# Altium footprint library CAP_TH.PcbLib: 219 footprints (part 8 of 14)
Each footprint in its own frame and in the unit in brackets; x right, y up, seen from the top. Pads: shape width x height; smd on the part's side, far side on the other; paste and mask are expansions set on the pad; w line width, h text height; cw(c..) or ccw(c..) is an arc to the next point about the centre after c.
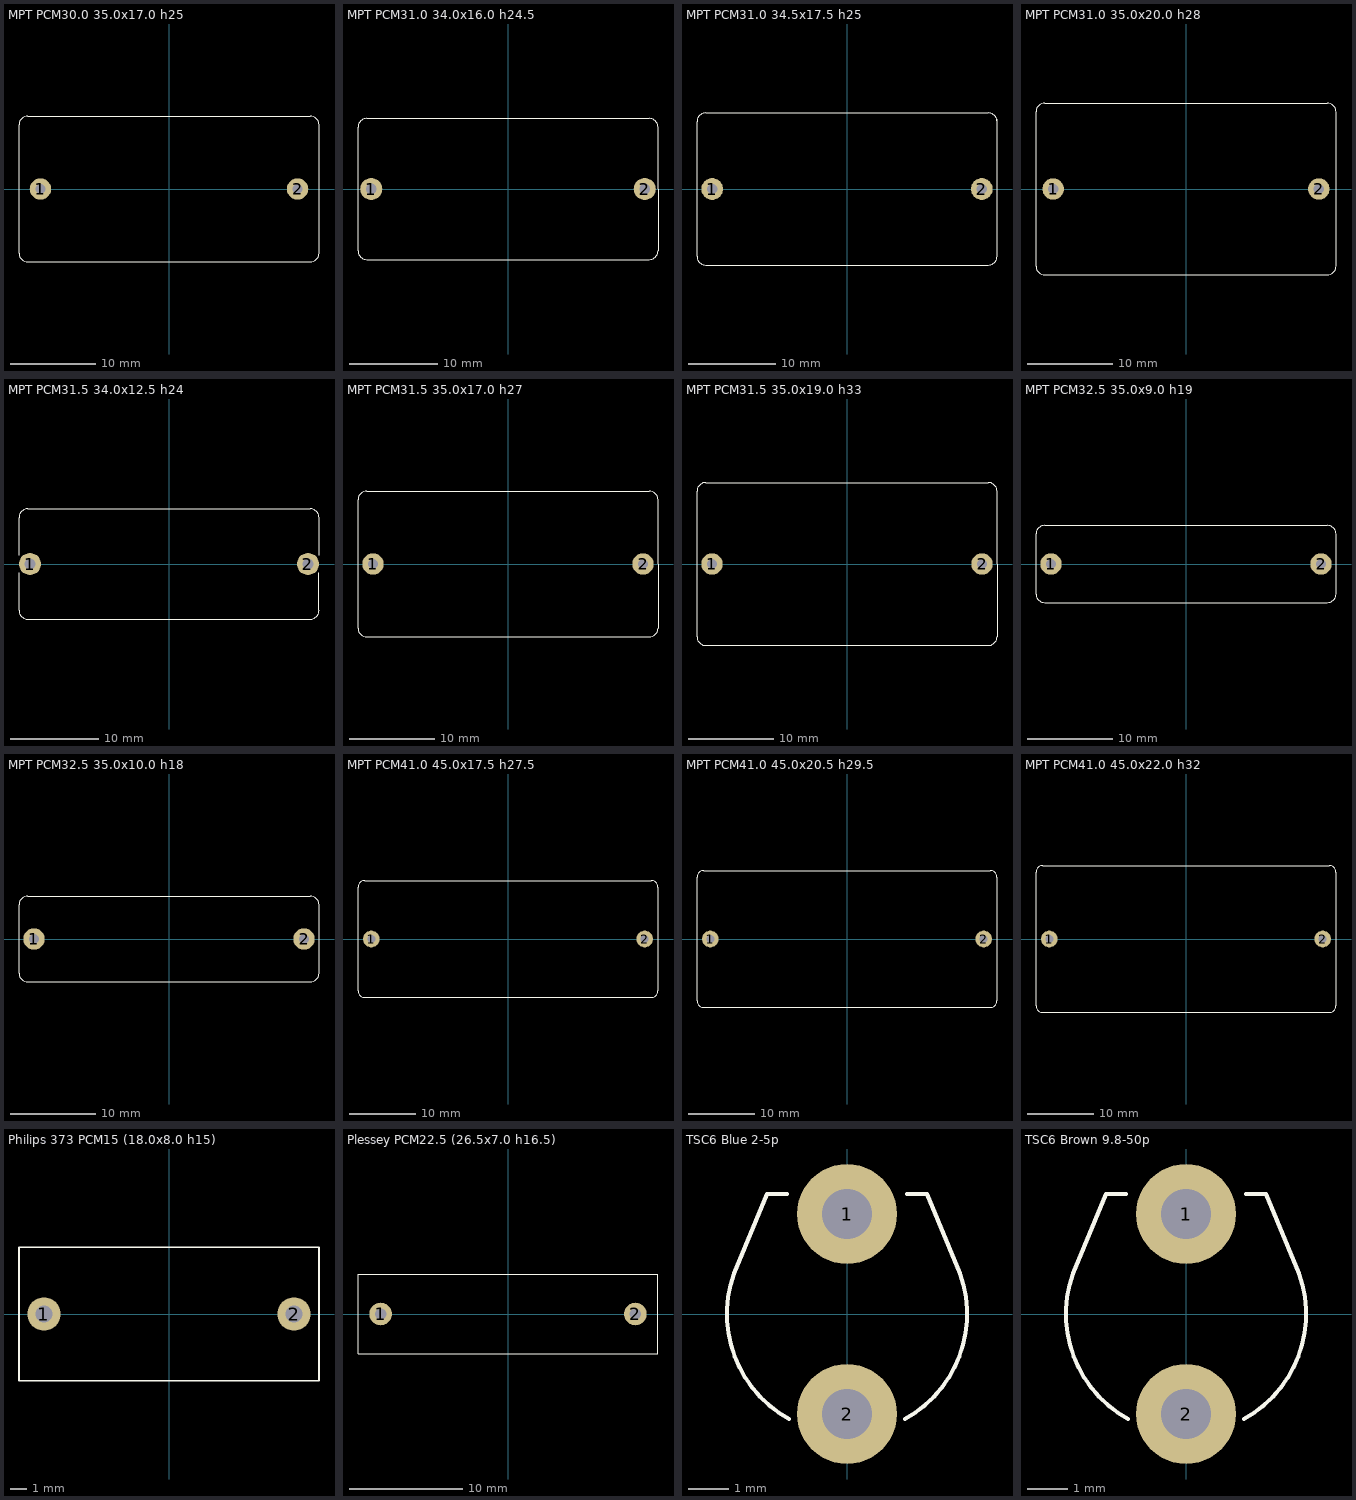
[diagram p7: the footprints below, top view; thin cyan lines are the x and y axes]

## MPT PCM30.0 35.0x17.0 h25 [mm]
pads (2):
  round 2.5 hole 1.2: 1(-15,0) 2(15,0)
Top Overlay:
  lines w0.1: -17.5,-7.5 ccw(c-16.5,-7.5) -16.5,-8.5 16.5,-8.5 ccw(c16.5,-7.5) 17.5,-7.5 17.5,7.5 ccw(c16.5,7.5) 16.5,8.5 -16.5,8.5 ccw(c-16.5,7.5) -17.5,7.5 -17.5,-7.5
3D body "MPT PCM30.0 35.0x17.0 h25.STEP": height 27, standoff -2, extent -17.5,-8.5 17.5,8.5

## MPT PCM31.0 34.0x16.0 h24.5 [mm]
pads (2):
  round 2.5 hole 1.2: 1(-15.5,0) 2(15.5,0)
Top Overlay:
  lines w0.1: -17,-7 ccw(c-16,-7) -16,-8 16,-8 ccw(c16,-7) 17,-7 17,7 ccw(c16,7) 16,8 -16,8 ccw(c-16,7) -17,7 -17,-7
3D body "MPT PCM31.0 34.0x16.0 h24.5.STEP": height 26.5, standoff -2, extent -17,-8 17,8

## MPT PCM31.0 34.5x17.5 h25 [mm]
pads (2):
  round 2.5 hole 1.2: 1(-15.5,0) 2(15.5,0)
Top Overlay:
  lines w0.1: 17.25,7.75 ccw(c16.25,7.75) 16.25,8.75 -16.25,8.75 ccw(c-16.25,7.75) -17.25,7.75 -17.25,-7.75 ccw(c-16.25,-7.75) -16.25,-8.75 16.25,-8.75 ccw(c16.25,-7.75) 17.25,-7.75 17.25,8
3D body "MPT PCM31.0 34.5x17.5 h25.STEP": height 27, standoff -2, extent -17.25,-8.75 17.25,8.75

## MPT PCM31.0 35.0x20.0 h28 [mm]
pads (2):
  round 2.5 hole 1.2: 1(-15.5,0) 2(15.5,0)
Top Overlay:
  lines w0.1: -17.5,-9 ccw(c-16.5,-9) -16.5,-10 16.5,-10 ccw(c16.5,-9) 17.5,-9 17.5,9 ccw(c16.5,9) 16.5,10 -16.5,10 ccw(c-16.5,9) -17.5,9 -17.5,-9
3D body "MPT PCM31.0 35.0x20.0 h28.STEP": height 30, standoff -2, extent -17.5,-10 17.5,10

## MPT PCM31.5 34.0x12.5 h24 [mm]
pads (2):
  round 2.5 hole 1.2: 1(-15.75,0) 2(15.75,0)
Top Overlay:
  lines w0.1: -17,-1 -17,-5.25 ccw(c-16,-5.25) -16,-6.25 16,-6.25 ccw(c16,-5.25) 17,-5.25 17,-1 ; -17,1 -17,5.25 cw(c-16,5.25) -16,6.25 16,6.25 cw(c16,5.25) 17,5.25 17,1
3D body "MPT PCM31.5 34.0x12.5 h24.STEP": height 26, standoff -2, extent -17,-6.25 17,6.25

## MPT PCM31.5 35.0x17.0 h27 [mm]
pads (2):
  round 2.5 hole 1.2: 1(-15.75,0) 2(15.75,0)
Top Overlay:
  lines w0.1: -17.5,-7.5 ccw(c-16.5,-7.5) -16.5,-8.5 16.5,-8.5 ccw(c16.5,-7.5) 17.5,-7.5 17.5,7.5 ccw(c16.5,7.5) 16.5,8.5 -16.5,8.5 ccw(c-16.5,7.5) -17.5,7.5 -17.5,-7.5
3D body "MPT PCM31.5 35.0x17.0 h27.STEP": height 29, standoff -2, extent -17.5,-8.5 17.5,8.5

## MPT PCM31.5 35.0x19.0 h33 [mm]
pads (2):
  round 2.5 hole 1.2: 1(-15.75,0) 2(15.75,0)
Top Overlay:
  lines w0.1: -17.5,-8.5 ccw(c-16.5,-8.5) -16.5,-9.5 16.5,-9.5 ccw(c16.5,-8.5) 17.5,-8.5 17.5,8.5 ccw(c16.5,8.5) 16.5,9.5 -16.5,9.5 ccw(c-16.5,8.5) -17.5,8.5 -17.5,-8.5
3D body "MPT PCM31.5 35.0x19.0 h33.STEP": height 35, standoff -2, extent -17.5,-9.5 17.5,9.5

## MPT PCM32.5 35.0x9.0 h19 [mm]
pads (2):
  round 2.5 hole 1.2: 1(-15.75,0) 2(15.75,0)
Top Overlay:
  lines w0.1: -17.5,-3.5 ccw(c-16.5,-3.5) -16.5,-4.5 16.5,-4.5 ccw(c16.5,-3.5) 17.5,-3.5 17.5,3.5 ccw(c16.5,3.5) 16.5,4.5 -16.5,4.5 ccw(c-16.5,3.5) -17.5,3.5 -17.5,-3.5
3D body "MPT PCM32.5 35.0x9.0 h19.STEP": height 21, standoff -2, extent -17.5,-4.5 17.5,4.5

## MPT PCM32.5 35.0x10.0 h18 [mm]
pads (2):
  round 2.5 hole 1.2: 1(-15.75,0) 2(15.75,0)
Top Overlay:
  lines w0.1: -17.5,-4 ccw(c-16.5,-4) -16.5,-5 16.5,-5 ccw(c16.5,-4) 17.5,-4 17.5,4 ccw(c16.5,4) 16.5,5 -16.5,5 ccw(c-16.5,4) -17.5,4 -17.5,-4
3D body "MPT PCM32.5 35.0x10.0 h18.STEP": height 20, standoff -2, extent -17.5,-5 17.5,5

## MPT PCM41.0 45.0x17.5 h27.5 [mm]
pads (2):
  round 2.5 hole 1.2: 1(-20.5,0) 2(20.5,0)
Top Overlay:
  lines w0.1: -22.5,-7.75 ccw(c-21.5,-7.75) -21.5,-8.75 21.5,-8.75 ccw(c21.5,-7.75) 22.5,-7.75 22.5,7.75 ccw(c21.5,7.75) 21.5,8.75 -21.5,8.75 ccw(c-21.5,7.75) -22.5,7.75 -22.5,-7.75
3D body "MPT PCM41.0 45.0x17.5 h27.5.STEP": height 29.5, standoff -2, extent -22.5,-8.75 22.5,8.75

## MPT PCM41.0 45.0x20.5 h29.5 [mm]
pads (2):
  round 2.5 hole 1.2: 1(-20.5,0) 2(20.5,0)
Top Overlay:
  lines w0.1: -22.5,-9.25 ccw(c-21.5,-9.25) -21.5,-10.25 21.5,-10.25 ccw(c21.5,-9.25) 22.5,-9.25 22.5,9.25 ccw(c21.5,9.25) 21.5,10.25 -21.5,10.25 ccw(c-21.5,9.25) -22.5,9.25 -22.5,-9.25
3D body "MPT PCM41.0 45.0x20.5 h29.5.STEP": height 31.5, standoff -2, extent -22.5,-10.25 22.5,10.25

## MPT PCM41.0 45.0x22.0 h32 [mm]
pads (2):
  round 2.5 hole 1.2: 1(-20.5,0) 2(20.5,0)
Top Overlay:
  lines w0.1: -22.5,-10 ccw(c-21.5,-10) -21.5,-11 21.5,-11 ccw(c21.5,-10) 22.5,-10 22.5,10 ccw(c21.5,10) 21.5,11 -21.5,11 ccw(c-21.5,10) -22.5,10 -22.5,-10
3D body "MPT PCM41.0 45.0x22.0 h32.STEP": height 34, standoff -2, extent -22.5,-11 22.5,11

## Philips 373 PCM15 (18.0x8.0 h15) [mm]
pads (2):
  round 2 hole 1: 1(-7.5,0) 2(7.5,0)
Top Overlay:
  lines w0.1: -9,-4 -9,4 9,4 9,-4 -9,-4
3D body "Philips 373 PCM15 (18.0x8.0 h15).STEP": height 15, standoff -2, extent -9,-4 9,4

## Plessey PCM22.5 (26.5x7.0 h16.5) [mm]
pads (2):
  round 2 hole 1: 1(-11.25,0) 2(11.25,0)
Top Overlay:
  lines w0.1: -13.25,-3.5 13.25,-3.5 13.25,3.5 -13.25,3.5 -13.25,-3.5
3D body "Plessey PCM22.5 (26.5x7.0 h16.5).STEP": height 15.5, standoff -2, extent -13.25,-3.5 13.25,3.5

## TSC6 Blue 2-5p [mm]
pads (2):
  round 2.5 hole 1.25: 1(0,2.5) 2(0,-2.5)
Top Overlay:
  lines w0.1: -1.5,3 -2,3 -2.824,1.011 ccw(c0,0) -1.454,-2.624 ; 1.454,-2.624 ccw(c0,0) 2.824,1.011 2,3 1.5,3
3D body "TSC6 Blue 2-5p.STEP": height 4.8, standoff -2.11, extent -3,-3 3,3

## TSC6 Brown 9.8-50p [mm]
pads (2):
  round 2.5 hole 1.25: 1(0,2.5) 2(0,-2.5)
Top Overlay:
  lines w0.1: -1.5,3 -2,3 -2.824,1.011 ccw(c0,0) -1.454,-2.624 ; 1.454,-2.624 ccw(c0,0) 2.824,1.011 2,3 1.5,3
3D body "TSC6 Brown 9.8-50p.STEP": height 4.8, standoff -2.11, extent -3,-3 3,3